# Altium integrated library TG21_Slave_Device_Led.IntLib: 11 symbols
Pins are listed as number, name and electrical type; pins without a type are passive.

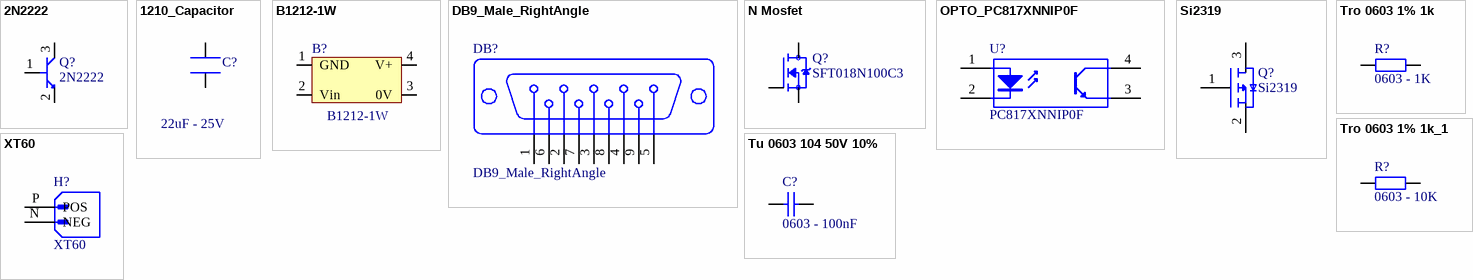
[diagram p0: symbols 2N2222 to XT60]

## 2N2222
designator Q?
footprint SOT23_HVT
pins: 1 B, 2 E, 3 C

## 1210_Capacitor
designator C?, comment 22uF - 25V
25V 22uF X7R ±10% 1210 Ceramic Capacitors ROHS
footprint 1210-Capacitor
pins: 1, 2

## B1212-1W
designator B?
footprint SIP-4
pins: 1 GND, 2 Vin, 3 0V, 4 V+

## DB9_Male_RightAngle
designator DB?
footprint DB9-F+M
pins: 1, 2, 3, 4, 5, 6, 7, 8, 9

## N Mosfet
designator Q?, comment SFT018N100C3
100V 320A 312W 1.8mΩ@10V 4V@250uA 1 N-Channel TOLL MOSFETs ROHS
footprint To263 2L
footprint TOLL
pins: 1 G, 2 S, 3 D

## OPTO_PC817XNNIP0F
designator U?, comment PC817XNNIP0F
OPTOISOLATOR 5KV TRANS 4SMD; Manufacturer: SHARP/Socle Technology; Voltage - Isolation: 5000Vrms; Current Transfer Ratio (Min): 50% @ 5mA; Current Transfer Ratio (Max): 600% @ 5mA; Rise / Fall Time (Typ): 4µs, 3µs; Input Type: DC; Output Type: Transistor; Voltage - Output (Max): 80V; Current - Output / Channel: 50mA; Voltage - Forward (Vf) (Typ): 1.2V; Vce Saturation (Max): 200mV; Supplier 1: Digi-Key; Manufacturer Part Number: PC817XNNIP0F; RoHS: RoHS Compliant; Category: Isolators; Stock 1: 0; Pricing 1: 1=0 (USD); Packaging: Cut Tape (CT); Part Status: Discontinued at Digi-Key; Turn On / Turn Off Time (Typ): -; Operating Temperature: -30°C ~ 100°C; Mounting Type: Surface Mount; Package / Case: 4-SMD, Gull Wing; Supplier Device Package: 4-SMD; ComponentLink1URL: http://www.sharp.co.jp/products/device/doc/opto/pc817xnnsz_j.pdf; ComponentLink1Description: http://www.sharp.co.jp/products/device/doc/opto/pc817xnnsz_j.pdf; Supplier Part Number 1: 425-2774-1-ND
footprint OPTO_4-SMD
pins: 1 A "Anode", 2 K "Cathode", 3 E "Emitter", 4 C "Collector"

## Si2319
designator Q?
Si2319, PMOS, SMD SOT23.
footprint SI2319
pins: 1 Gate, 2 Source, 3 Drain

## Tro 0603 1% 1k
designator R?, comment 0603 - 1K
100mW Thick Film Resistor 75V ±100ppm/℃ ±1% 1kΩ 0603 Chip Resistor - Surface Mount ROHS; Chung_Loai: Dán; So_Chan: 2; Don_Vi: Con; Ten_Linh_Kien: Trở 0603 1% 1k; Ma_Hang: MH006334; Kieu_Chan: *
footprint tro smd 0603 (Chip Capacitor, 2-Leads, Body 1,60x0,80mm, IPC Medium Density)
pins: 1, 2

## Tro 0603 1% 1k_1
designator R?, comment 0603 - 10K
100mW Thick Film Resistor 75V ±100ppm/℃ ±1% 10kΩ 0603 Chip Resistor - Surface Mount ROHS; Chung_Loai: Dán; So_Chan: 2; Don_Vi: Con; Ten_Linh_Kien: Trở 0603 1% 1k; Ma_Hang: MH006334; Kieu_Chan: *
footprint tro smd 0603 (Chip Capacitor, 2-Leads, Body 1,60x0,80mm, IPC Medium Density)
pins: 1, 2

## Tu 0603 104 50V 10%
designator C?, comment 0603 - 100nF
50V 100nF X7R ±10% 0603 Multilayer Ceramic Capacitors MLCC - SMD/SMT ROHS; Chung_Loai: Dán; Don_Vi: Con; So_Chan: 2; Ten_Linh_Kien: Tụ 0603 104-100nF 10% 50V; Ma_Hang: MH004568; Kieu_Chan: *
footprint tu 0603 (Chip Capacitor, 2-Leads, Body 1,60x0,80mm, IPC Medium Density)
pins: 1, 2

## XT60
designator H?
footprint XT60_PW
footprint XT60H-F
footprint XT60H-M
pins: N NEG, P POS